# Altium footprint library DBLib.PcbLib: 92 footprints (part 5 of 6)
Each footprint in its own frame and in the unit in brackets; x right, y up, seen from the top. Pads: shape width x height; smd on the part's side, far side on the other; paste and mask are expansions set on the pad; w line width, h text height; cw(c..) or ccw(c..) is an arc to the next point about the centre after c.
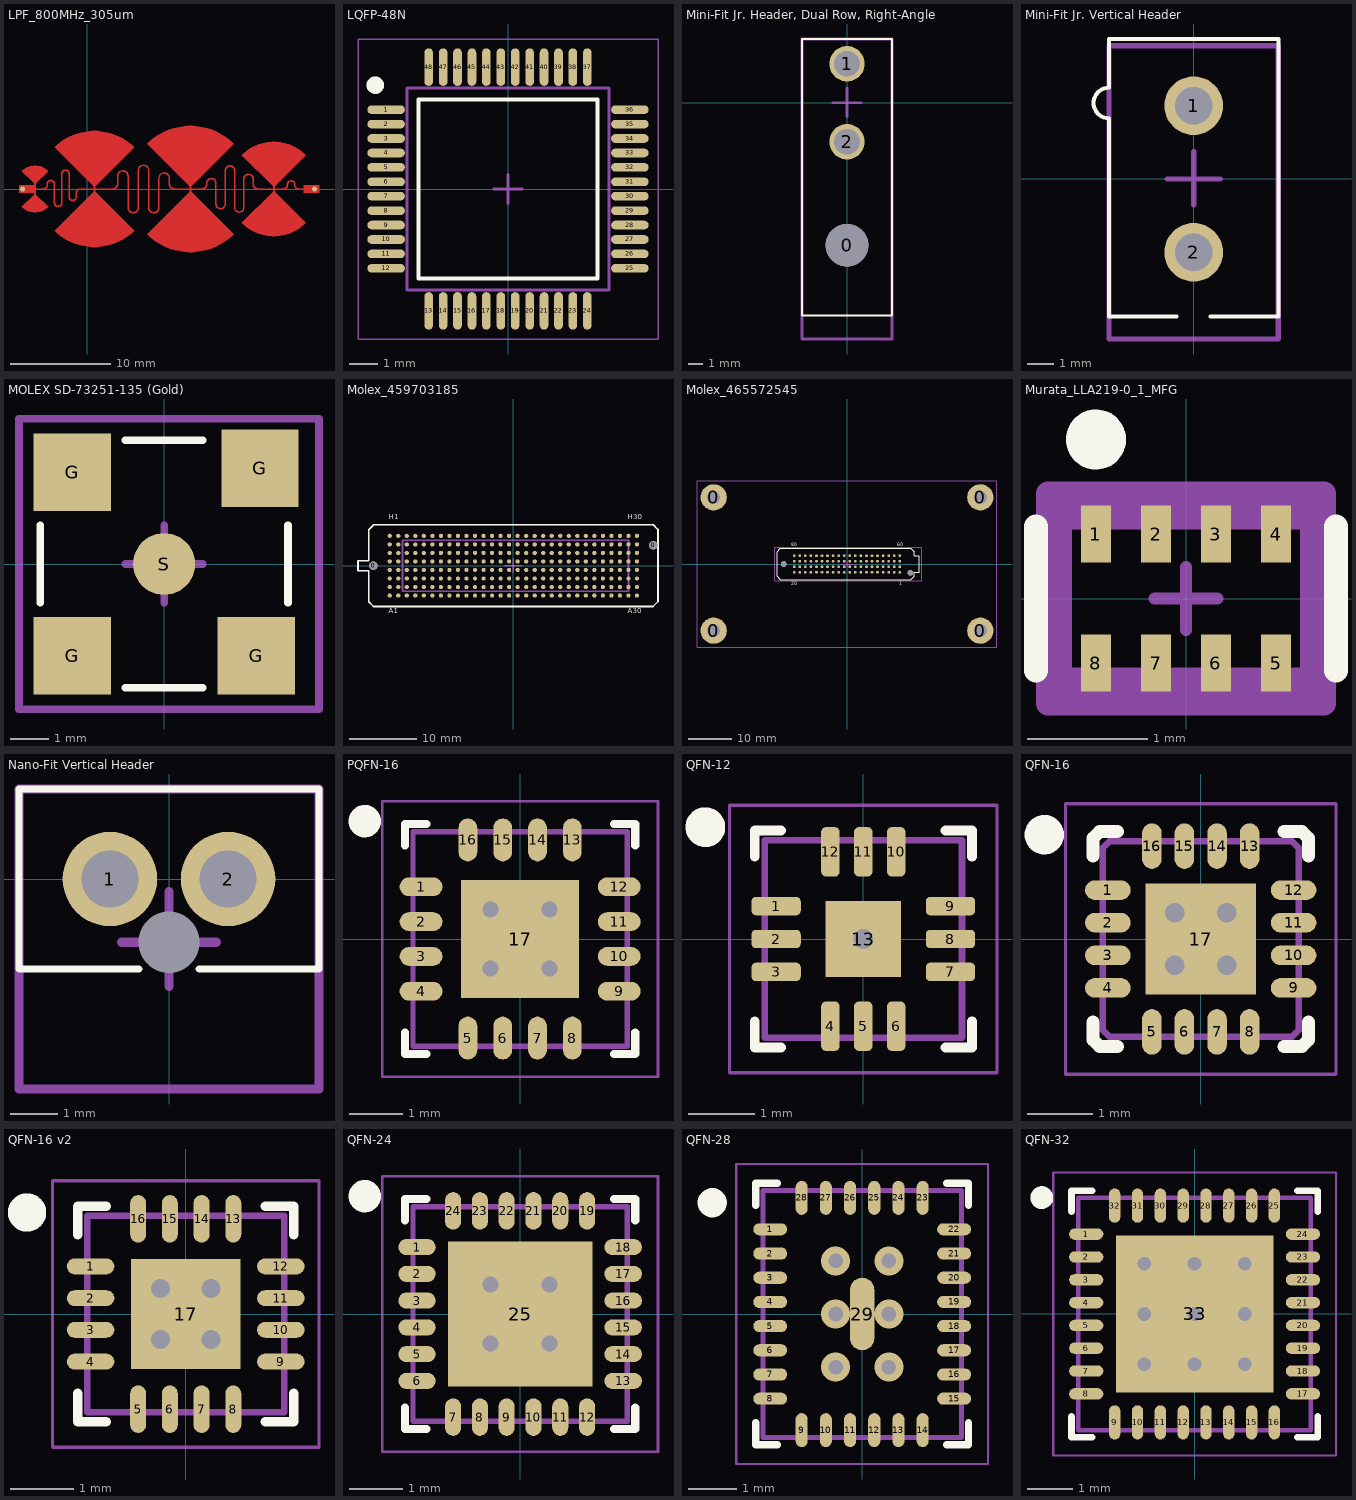
[diagram p4: the footprints below, top view; thin cyan lines are the x and y axes]

## LPF_800MHz_305um [mm] "stripline LPF"
pads (2):
  round 0.5 smd: IN(-6.4,0) OUT(22.606,0)
Top Layer:
  region: -6.757,-0.355 -5.232,-0.355 -5.232,0.355 -6.757,0.355
  region: -5.232,-0.562 -5.234,-0.562 -5.236,-0.561 -5.238,-0.559 -5.239,-0.557 -5.239,-0.555 -5.239,0.555 -5.239,0.557 -5.238,0.559 -5.236,0.561 -5.234,0.562 -5.232,0.562 -5.08,0.562 -5.079,0.562 -5.076,0.561 -5.074,0.559 -5.073,0.557 -5.073,0.555 -5.073,-0.555 -5.073,-0.557 -5.074,-0.559 -5.076,-0.561 -5.079,-0.562 -5.08,-0.562
  region: -5.232,0.555 -6.459,1.782 -6.331,1.911 -6.029,2.112 -5.694,2.251 -5.338,2.322 -5.156,2.322 -4.975,2.322 -4.619,2.251 -4.283,2.112 -3.981,1.911 -3.853,1.782 -5.08,0.555
  region: -6.459,-1.782 -6.331,-1.911 -6.029,-2.112 -5.694,-2.251 -5.338,-2.322 -5.156,-2.322 -4.975,-2.322 -4.619,-2.251 -4.283,-2.112 -3.981,-1.911 -3.853,-1.782 -5.08,-0.555 -5.232,-0.555
  region: 0.658,-0.262 0.658,0.262 0.811,0.262 0.811,-0.262
  region: -3.212,-4.133 -3.018,-4.326 -2.594,-4.674 -2.138,-4.979 -1.655,-5.237 -1.148,-5.447 -0.623,-5.607 -0.086,-5.714 0.46,-5.767 0.734,-5.767 1.008,-5.767 1.554,-5.714 2.092,-5.607 2.617,-5.447 3.123,-5.237 3.607,-4.979 4.063,-4.674 4.487,-4.326 4.681,-4.133 0.811,-0.262 0.658,-0.262
  region: 0.658,0.262 -3.212,4.133 -3.018,4.326 -2.594,4.674 -2.138,4.979 -1.655,5.237 -1.148,5.447 -0.623,5.607 -0.086,5.714 0.46,5.767 0.734,5.767 1.008,5.767 1.554,5.714 2.092,5.607 2.617,5.447 3.123,5.237 3.607,4.979 4.063,4.674 4.487,4.326 4.681,4.133 0.811,0.262
  region: 10.201,-0.262 10.354,-0.262 10.354,0.262 10.201,0.262
  region: 5.977,4.487 10.201,0.262 10.354,0.262 14.578,4.487 14.367,4.698 13.905,5.077 13.408,5.409 12.881,5.691 12.329,5.92 11.757,6.093 11.171,6.21 10.576,6.268 10.278,6.268 9.979,6.268 9.384,6.21 8.798,6.093 8.226,5.92 7.674,5.691 7.147,5.409 6.65,5.077 6.188,4.698
  region: 5.977,-4.487 6.188,-4.698 6.65,-5.077 7.147,-5.409 7.674,-5.691 8.226,-5.92 8.798,-6.093 9.384,-6.21 9.979,-6.268 10.278,-6.268 10.576,-6.268 11.171,-6.21 11.757,-6.093 12.329,-5.92 12.881,-5.691 13.408,-5.409 13.905,-5.077 14.367,-4.698 14.578,-4.487 10.354,-0.262 10.201,-0.262
  region: 18.486,-0.262 18.486,0.262 18.638,0.262 18.638,-0.262
  region: 15.379,-3.369 15.536,-3.525 15.878,-3.806 16.245,-4.052 16.635,-4.26 17.044,-4.429 17.467,-4.558 17.901,-4.644 18.341,-4.687 18.562,-4.687 18.783,-4.687 19.223,-4.644 19.657,-4.558 20.08,-4.429 20.489,-4.26 20.879,-4.052 21.247,-3.806 21.588,-3.525 21.745,-3.369 18.638,-0.262 18.486,-0.262
  region: 15.379,3.369 18.486,0.262 18.638,0.262 21.745,3.369 21.588,3.525 21.247,3.806 20.879,4.052 20.489,4.26 20.08,4.429 19.657,4.558 19.223,4.644 18.783,4.687 18.562,4.687 18.341,4.687 17.901,4.644 17.467,4.558 17.044,4.429 16.635,4.26 16.245,4.052 15.878,3.806 15.536,3.525
  region: 21.528,-0.355 21.528,0.355 23.053,0.355 23.053,-0.355
  lines w0.125: -5.08,0 -4.318,0 ccw(c-4.318,0.362) -3.956,0.362 -3.956,0.486 cw(c-3.593,0.486) -3.593,0.848 ; 0.658,0 0,0 -0.693,0 ccw(c-0.693,-0.362) -1.056,-0.362 -1.056,-0.782 cw(c-1.418,-0.782) -1.418,-1.145 ; 0.811,0 2.54,0 ccw(c2.54,0.512) 3.052,0.512 3.052,1.299 cw(c3.565,1.299) 3.565,1.812 ; 10.201,0 9.652,0 8.69,0 cw(c8.69,0.513) 8.177,0.513 8.177,1.081 ccw(c7.665,1.081) 7.665,1.594 ; 10.354,0 11.43,0 ccw(c11.43,0.462) 11.892,0.462 11.892,0.57 cw(c12.355,0.57) 12.355,1.033 ; 18.486,0 17.78,0 16.98,0 cw(c16.98,0.462) 16.517,0.462 16.517,1 ccw(c16.055,1) 16.055,1.462 ; 18.638,0 19.558,0 ccw(c19.558,0.362) 19.92,0.362 19.92,0.449 cw(c20.283,0.449) 20.283,0.811 ; 21.528,0 21.336,0 21.008,0 cw(c21.008,0.362) 20.645,0.362 20.645,0.449 ccw(c20.283,0.449) 20.283,0.811 ; -3.593,0.848 cw(c-3.593,0.486) -3.231,0.486 -3.231,0 -3.231,-1.379 ccw(c-2.868,-1.379) -2.868,-1.741 ; -3.593,0.848 -3.593,0.848 ; -3.593,0.848 -3.593,0.848 ; -2.868,-1.741 ccw(c-2.868,-1.379) -2.506,-1.379 -2.506,0 -2.506,1.507 cw(c-2.143,1.507) -2.143,1.87 ; -2.868,-1.741 -2.868,-1.741 ; -2.868,-1.741 -2.868,-1.741 ; -2.143,1.87 cw(c-2.143,1.507) -1.781,1.507 -1.781,0 -1.781,-0.782 ccw(c-1.418,-0.782) -1.418,-1.145 ; -2.143,1.87 -2.143,1.87 ; -2.143,1.87 -2.143,1.87 ; -1.418,-1.145 -1.418,-1.145 ; -1.418,-1.145 -1.418,-1.145 ; 3.565,1.812 cw(c3.565,1.299) 4.077,1.299 4.077,0 4.077,-1.84 ccw(c4.59,-1.84) 4.59,-2.353 ; 3.565,1.812 3.565,1.812 ; 3.565,1.812 3.565,1.812 ; 4.59,-2.353 ccw(c4.59,-1.84) 5.102,-1.84 5.102,0 5.102,1.84 cw(c5.615,1.84) 5.615,2.353 ; 4.59,-2.353 4.59,-2.353 ; 4.59,-2.353 4.59,-2.353 ; 5.615,2.353 cw(c5.615,1.84) 6.127,1.84 6.127,0 6.127,-1.84 ccw(c6.64,-1.84) 6.64,-2.353 ; 5.615,2.353 5.615,2.353 ; 5.615,2.353 5.615,2.353 ; 6.64,-2.353 ccw(c6.64,-1.84) 7.152,-1.84 7.152,0 7.152,1.081 cw(c7.665,1.081) 7.665,1.594 ; 6.64,-2.353 6.64,-2.353 ; 6.64,-2.353 6.64,-2.353 ; 7.665,1.594 7.665,1.594 ; 7.665,1.594 7.665,1.594 ; 12.355,1.033 cw(c12.355,0.57) 12.817,0.57 12.817,0 12.817,-1.495 ccw(c13.28,-1.495) 13.28,-1.958 ; 12.355,1.033 12.355,1.033 ; 12.355,1.033 12.355,1.033 ; 13.28,-1.958 ccw(c13.28,-1.495) 13.742,-1.495 13.742,0 13.742,1.844 cw(c14.205,1.844) 14.205,2.306 ; 13.28,-1.958 13.28,-1.958 ; 13.28,-1.958 13.28,-1.958 ; 14.205,2.306 cw(c14.205,1.844) 14.667,1.844 14.667,0 14.667,-1.844 ccw(c15.13,-1.844) 15.13,-2.306 ; 14.205,2.306 14.205,2.306 ; 14.205,2.306 14.205,2.306 ; 15.13,-2.306 ccw(c15.13,-1.844) 15.592,-1.844 15.592,0 15.592,1 cw(c16.055,1) 16.055,1.462 ; 15.13,-2.306 15.13,-2.306 ; 15.13,-2.306 15.13,-2.306 ; 16.055,1.462 16.055,1.462 ; 16.055,1.462 16.055,1.462 ; 20.283,0.811 20.283,0.811 ; 20.283,0.811 20.283,0.811

## LQFP-48N [mm] "TSQFP, 48-Leads, Body 7,00x7,00mm, Pitch 0,50mm, IPC Medium Density"
height 1.6
pads (48):
  oval 1.3x0.3 smd: 1(-4.225,2.75) 2(-4.225,2.25) 3(-4.225,1.75) 4(-4.225,1.25) 5(-4.225,0.75) 6(-4.225,0.25) 7(-4.225,-0.25) 8(-4.225,-0.75) 9(-4.225,-1.25) 10(-4.225,-1.75) 11(-4.225,-2.25) 12(-4.225,-2.75) 25(4.225,-2.75) 26(4.225,-2.25) 27(4.225,-1.75) 28(4.225,-1.25) 29(4.225,-0.75) 30(4.225,-0.25) 31(4.225,0.25) 32(4.225,0.75) 33(4.225,1.25) 34(4.225,1.75) 35(4.225,2.25) 36(4.225,2.75)
  oval 0.3x1.3 smd: 13(-2.75,-4.225) 14(-2.25,-4.225) 15(-1.75,-4.225) 16(-1.25,-4.225) 17(-0.75,-4.225) 18(-0.25,-4.225) 19(0.25,-4.225) 20(0.75,-4.225) 21(1.25,-4.225) 22(1.75,-4.225) 23(2.25,-4.225) 24(2.75,-4.225) 37(2.75,4.225) 38(2.25,4.225) 39(1.75,4.225) 40(1.25,4.225) 41(0.75,4.225) 42(0.25,4.225) 43(-0.25,4.225) 44(-0.75,4.225) 45(-1.25,4.225) 46(-1.75,4.225) 47(-2.25,4.225) 48(-2.75,4.225)
Top Overlay:
  circle w0.35: c-4.6,3.6 r0.127
  lines w0.15: -3.1,-3.1 3.1,-3.1 3.1,3.1 -3.1,3.1 -3.1,-3.1
Mechanical 1:
  lines w0.05: -5.2,-5.2 5.2,-5.2 5.2,5.2 -5.2,5.2 -5.2,-5.2
  lines w0.1: -0.5,0 0.5,0 ; 0,-0.5 0,0.5 ; -3.5,-3.5 3.5,-3.5 3.5,3.5 -3.5,3.5 -3.5,-3.5
3D body "User Library-LQFP50P900X900X160.STEP": height 1.6, standoff 0, extent -4.5,-4.5 4.5,4.5

## Mini-Fit Jr. Header, Dual Row, Right-Angle [mm] "Mini-Fit Jr. Header, Dual Row, Right-Angle"
height 9.6
pads (3):
  round 3 hole 3 unplated: 0(0,-10.05)
  round 2.5 hole 1.8: 1(0,2.75) 2(0,-2.75)
Top Overlay:
  lines w0.15: -3.175,-15 -3.175,4.5 3.175,4.5 3.175,-15 -3.175,-15
Mechanical 1:
  lines w0.2: -1,0 1,0 ; 0,-0.97 0,1.03 ; -3.175,-16.668 3.175,-16.668 3.175,4.5 -3.175,4.5 -3.175,-16.668
3D body "026013114.stp": height 11.48, standoff -3.52, extent -2.7,-16.668 3.1,3.267

## Mini-Fit Jr. Vertical Header [mm] "4.20mm Pitch, Dual Row"
height 12.8
pads (2):
  round 2.2 hole 1.4: 1(0,2.75) 2(0,-2.75)
Top Overlay:
  lines w0.15: -0.635,-5.155 -3.175,-5.155 -3.175,2.275 cw(c-3.175,2.85) -3.175,3.425 -3.175,5.25 3.175,5.25 3.175,-5.155 0.635,-5.155
Mechanical 1:
  lines w0.2: -1,0 1,0 ; 0,-0.97 0,1.03 ; -3.175,-6 -3.175,5 3.175,5 3.175,-6 -3.175,-6
3D body "039281023.stp": height 12.88, standoff -3.42, extent -3.1,-5.95 3.1,5.05

## MOLEX SD-73251-135 (Gold) [mm]
pads (5):
  rect 2x2 smd: G(-2.375,-2.375) G(-2.375,2.375) G(2.375,-2.375) G(2.475,2.475)
  round 1.6 smd: S(0,0)
Top Overlay:
  lines w0.2: -3.2,-1 -3.2,1 ; -1,-3.2 1,-3.2 ; -1,3.2 1,3.2 ; 3.2,-1 3.2,1
Mechanical 1:
  lines w0.2: -1,0 1,0 ; 0,-1 0,1 ; -3.75,-3.75 4,-3.75 4,3.75 -3.75,3.75 -3.75,-3.75
3D body "MOLEX SD-73251-135 Gold.stp": height 9.52, standoff -0.11, extent -3.175,-3.175 3.175,3.175

## Molex_459703185 [mm] "SEARAY Plug, 240 Circuits, 2.00mm Unmated Height, 8 Rows"
height 2
pads (242):
  round 1.27 hole 1.27 unplated: 0(-20.845,0) 0(20.845,3.05)
  round 0.635 smd: A1(-18.415,-4.445) A2(-17.145,-4.445) A3(-15.875,-4.445) A4(-14.605,-4.445) A5(-13.335,-4.445) A6(-12.065,-4.445) A7(-10.795,-4.445) A8(-9.525,-4.445) A9(-8.255,-4.445) A10(-6.985,-4.445) A11(-5.715,-4.445) A12(-4.445,-4.445) A13(-3.175,-4.445) A14(-1.905,-4.445) A15(-0.635,-4.445) A16(0.635,-4.445) A17(1.905,-4.445) A18(3.175,-4.445) A19(4.445,-4.445) A20(5.715,-4.445) A21(6.985,-4.445) A22(8.255,-4.445) A23(9.525,-4.445) A24(10.795,-4.445) A25(12.065,-4.445) A26(13.335,-4.445) A27(14.605,-4.445) A28(15.875,-4.445) A29(17.145,-4.445) A30(18.415,-4.445) B1(-18.415,-3.175) B2(-17.145,-3.175) B3(-15.875,-3.175) B4(-14.605,-3.175) B5(-13.335,-3.175) B6(-12.065,-3.175) B7(-10.795,-3.175) B8(-9.525,-3.175) B9(-8.255,-3.175) B10(-6.985,-3.175) B11(-5.715,-3.175) B12(-4.445,-3.175) B13(-3.175,-3.175) B14(-1.905,-3.175) B15(-0.635,-3.175) B16(0.635,-3.175) B17(1.905,-3.175) B18(3.175,-3.175) B19(4.445,-3.175) B20(5.715,-3.175) B21(6.985,-3.175) B22(8.255,-3.175) B23(9.525,-3.175) B24(10.795,-3.175) B25(12.065,-3.175) B26(13.335,-3.175) B27(14.605,-3.175) B28(15.875,-3.175) B29(17.145,-3.175) B30(18.415,-3.175) C1(-18.415,-1.905) C2(-17.145,-1.905) C3(-15.875,-1.905) C4(-14.605,-1.905) C5(-13.335,-1.905) C6(-12.065,-1.905) C7(-10.795,-1.905) C8(-9.525,-1.905) C9(-8.255,-1.905) C10(-6.985,-1.905) C11(-5.715,-1.905) C12(-4.445,-1.905) C13(-3.175,-1.905) C14(-1.905,-1.905) C15(-0.635,-1.905) C16(0.635,-1.905) C17(1.905,-1.905) C18(3.175,-1.905) C19(4.445,-1.905) C20(5.715,-1.905) C21(6.985,-1.905) C22(8.255,-1.905) C23(9.525,-1.905) C24(10.795,-1.905) C25(12.065,-1.905) C26(13.335,-1.905) C27(14.605,-1.905) C28(15.875,-1.905) C29(17.145,-1.905) C30(18.415,-1.905) D1(-18.415,-0.635) D2(-17.145,-0.635) D3(-15.875,-0.635) D4(-14.605,-0.635) D5(-13.335,-0.635) D6(-12.065,-0.635) D7(-10.795,-0.635) D8(-9.525,-0.635) D9(-8.255,-0.635) D10(-6.985,-0.635) D11(-5.715,-0.635) D12(-4.445,-0.635) D13(-3.175,-0.635) D14(-1.905,-0.635) D15(-0.635,-0.635) D16(0.635,-0.635) D17(1.905,-0.635) D18(3.175,-0.635) D19(4.445,-0.635) D20(5.715,-0.635) D21(6.985,-0.635) D22(8.255,-0.635) D23(9.525,-0.635) D24(10.795,-0.635) D25(12.065,-0.635) D26(13.335,-0.635) D27(14.605,-0.635) D28(15.875,-0.635) D29(17.145,-0.635) D30(18.415,-0.635) E1(-18.415,0.635) E2(-17.145,0.635) E3(-15.875,0.635) E4(-14.605,0.635) E5(-13.335,0.635) E6(-12.065,0.635) E7(-10.795,0.635) E8(-9.525,0.635) E9(-8.255,0.635) E10(-6.985,0.635) E11(-5.715,0.635) E12(-4.445,0.635) E13(-3.175,0.635) E14(-1.905,0.635) E15(-0.635,0.635) E16(0.635,0.635) E17(1.905,0.635) E18(3.175,0.635) E19(4.445,0.635) E20(5.715,0.635) E21(6.985,0.635) E22(8.255,0.635) E23(9.525,0.635) E24(10.795,0.635) E25(12.065,0.635) E26(13.335,0.635) E27(14.605,0.635) E28(15.875,0.635) E29(17.145,0.635) E30(18.415,0.635) F1(-18.415,1.905) F2(-17.145,1.905) F3(-15.875,1.905) F4(-14.605,1.905) F5(-13.335,1.905) F6(-12.065,1.905) F7(-10.795,1.905) F8(-9.525,1.905) F9(-8.255,1.905) F10(-6.985,1.905) F11(-5.715,1.905) F12(-4.445,1.905) F13(-3.175,1.905) F14(-1.905,1.905) F15(-0.635,1.905) F16(0.635,1.905) F17(1.905,1.905) F18(3.175,1.905) F19(4.445,1.905) F20(5.715,1.905) F21(6.985,1.905) F22(8.255,1.905) F23(9.525,1.905) F24(10.795,1.905) F25(12.065,1.905) F26(13.335,1.905) F27(14.605,1.905) F28(15.875,1.905) F29(17.145,1.905) F30(18.415,1.905) G1(-18.415,3.175) G2(-17.145,3.175) G3(-15.875,3.175) G4(-14.605,3.175) G5(-13.335,3.175) G6(-12.065,3.175) G7(-10.795,3.175) G8(-9.525,3.175) G9(-8.255,3.175) G10(-6.985,3.175) G11(-5.715,3.175) G12(-4.445,3.175) G13(-3.175,3.175) G14(-1.905,3.175) G15(-0.635,3.175) G16(0.635,3.175) G17(1.905,3.175) G18(3.175,3.175) G19(4.445,3.175) G20(5.715,3.175) G21(6.985,3.175) G22(8.255,3.175) G23(9.525,3.175) G24(10.795,3.175) G25(12.065,3.175) G26(13.335,3.175) G27(14.605,3.175) G28(15.875,3.175) G29(17.145,3.175) G30(18.415,3.175) H1(-18.415,4.445) H2(-17.145,4.445) H3(-15.875,4.445) H4(-14.605,4.445) H5(-13.335,4.445) H6(-12.065,4.445) H7(-10.795,4.445) H8(-9.525,4.445) H9(-8.255,4.445) H10(-6.985,4.445) H11(-5.715,4.445) H12(-4.445,4.445) H13(-3.175,4.445) H14(-1.905,4.445) H15(-0.635,4.445) H16(0.635,4.445) H17(1.905,4.445) H18(3.175,4.445) H19(4.445,4.445) H20(5.715,4.445) H21(6.985,4.445) H22(8.255,4.445) H23(9.525,4.445) H24(10.795,4.445) H25(12.065,4.445) H26(13.335,4.445) H27(14.605,4.445) H28(15.875,4.445) H29(17.145,4.445) H30(18.415,4.445)
Top Overlay:
  lines w0.254: -23.145,-0.76 -23.145,0.76 -21.545,0.76 -21.545,5.335 -20.8,6.08 20.844,6.08 21.545,5.379 21.545,-5.334 20.799,-6.08 -20.844,-6.08 -21.545,-5.379 -21.545,-0.76 -23.145,-0.76
  text "A30" at 17.018,-7.366 h1.27
  text "A1" at -18.542,-7.366 h1.27
  text "H30" at 17.018,6.604 h1.27
  text "H1" at -18.542,6.604 h1.27
Mechanical 1:
  lines w0.254: -1.016,0 1.016,0 ; 0,-0.762 0,0.762
Mechanical 15:
  lines w0.254: 0,-1.016 0,1.016 ; 0,-0.635 0,0.635 ; 0.635,0 1.27,0 ; 1.27,0 -1.27,0 1.27,0 ; -16.51,-3.81 -16.51,3.81 17.145,3.81 17.145,-3.81 -16.51,-3.81
3D body "459703185.stp": height 5.68, standoff -1.21, extent -23.127,-6.071 21.552,6.071

## Molex_465572545 [mm] "CONN FML 80POS 4ROWS GOLD"
height 8
pads (86):
  round 6 hole 3: 0(-30.48,-15.24) 0(-30.48,15.24) 0(30.48,-15.24) 0(30.48,15.24)
  round 1.27 hole 1.27 unplated: 0(-14.495,0) 0(14.495,-2.01)
  round 0.64 smd: 1(12.065,-1.905) 2(10.795,-1.905) 3(9.525,-1.905) 4(8.255,-1.905) 5(6.985,-1.905) 6(5.715,-1.905) 7(4.445,-1.905) 8(3.175,-1.905) 9(1.905,-1.905) 10(0.635,-1.905) 11(-0.635,-1.905) 12(-1.905,-1.905) 13(-3.175,-1.905) 14(-4.445,-1.905) 15(-5.715,-1.905) 16(-6.985,-1.905) 17(-8.255,-1.905) 18(-9.525,-1.905) 19(-10.795,-1.905) 20(-12.065,-1.905) 21(12.065,-0.635) 22(10.795,-0.635) 23(9.525,-0.635) 24(8.255,-0.635) 25(6.985,-0.635) 26(5.715,-0.635) 27(4.445,-0.635) 28(3.175,-0.635) 29(1.905,-0.635) 30(0.635,-0.635) 31(-0.635,-0.635) 32(-1.905,-0.635) 33(-3.175,-0.635) 34(-4.445,-0.635) 35(-5.715,-0.635) 36(-6.985,-0.635) 37(-8.255,-0.635) 38(-9.525,-0.635) 39(-10.795,-0.635) 40(-12.065,-0.635) 41(12.065,0.635) 42(10.795,0.635) 43(9.525,0.635) 44(8.255,0.635) 45(6.985,0.635) 46(5.715,0.635) 47(4.445,0.635) 48(3.175,0.635) 49(1.905,0.635) 50(0.635,0.635) 51(-0.635,0.635) 52(-1.905,0.635) 53(-3.175,0.635) 54(-4.445,0.635) 55(-5.715,0.635) 56(-6.985,0.635) 57(-8.255,0.635) 58(-9.525,0.635) 59(-10.795,0.635) 60(-12.065,0.635) 61(12.065,1.905) 62(10.795,1.905) 63(9.525,1.905) 64(8.255,1.905) 65(6.985,1.905) 66(5.715,1.905) 67(4.445,1.905) 68(3.175,1.905) 69(1.905,1.905) 70(0.635,1.905) 71(-0.635,1.905) 72(-1.905,1.905) 73(-3.175,1.905) 74(-4.445,1.905) 75(-5.715,1.905) 76(-6.985,1.905) 77(-8.255,1.905) 78(-9.525,1.905) 79(-10.795,1.905) 80(-12.065,1.905)
Top Overlay:
  lines w0.178: -16.002,-2.794 -15.24,-3.556 14.605,-3.556 15.367,-2.794 15.367,-1.905 16.51,-1.905 16.51,1.905 15.367,1.905 15.367,2.794 14.605,3.556 -15.24,3.556 -16.002,2.794 -16.002,-2.794
  text "80" at -12.7,4.064 h0.76
  text "60" at 11.43,4.064 h0.76
  text "20" at -12.7,-4.826 h0.76
  text "1" at 11.938,-4.826 h0.76
Mechanical 13:
  lines w0.254: -34.29,-19.05 -34.29,19.05 34.29,19.05 34.29,-19.05 -34.29,-19.05
Mechanical 15:
  lines w0.254: -1.27,0 1.27,0 0.635,0 ; 0,-0.635 0,0.635 ; -16.51,-3.81 17.145,-3.81 17.145,3.81 -16.51,3.81 -16.51,-3.81
3D body "465572545.stp": height 7.98, standoff -1.34, extent -16.027,-3.505 16.535,3.556

## Murata_LLA219-0_1_MFG [mm]
pads (8):
  rect 0.25x0.475 smd paste+0 mask+0: 1(-0.75,0.537) 2(-0.25,0.537) 3(0.25,0.537) 4(0.75,0.537) 5(0.75,-0.537) 6(0.25,-0.537) 7(-0.25,-0.537) 8(-0.75,-0.537)
Top Overlay:
  circle w0.25: c-0.75,1.325 r0.125
  lines w0.2: -1.25,-0.6 -1.25,0.6 ; 1.25,-0.6 1.25,0.6
Mechanical 10:
  lines w0.2: -1.15,-0.875 1.15,-0.875 1.15,0.875 -1.15,0.875 -1.15,-0.875
Mechanical 12:
  lines w0.2: -1.05,-0.675 1.05,-0.675 1.05,0.675 -1.05,0.675 -1.05,-0.675
Mechanical 15:
  lines w0.1: -0.262,0 0.262,0 ; 0,-0.262 0,0.262
  lines w0.2: -1.15,-0.875 1.15,-0.875 1.15,0.875 -1.15,0.875 -1.15,-0.875
3D body "Cap_Murata_LLA219C70G225MA01L_eec.STEP": height 0.25, standoff 0, extent -1.15,-0.875 1.15,0.875

## Nano-Fit Vertical Header [mm] "Through Hole, 2.50mm Pitch"
height 10
pads (3):
  round 0 hole 1.3 unplated: 0(0,-1.34)
  round 2 hole 1.2: 1(-1.25,0) 2(1.25,0)
Top Overlay:
  lines w0.15: -0.635,-1.905 -3.175,-1.905 -3.175,1.905 3.175,1.905 3.175,-1.905 0.635,-1.905
Mechanical 1:
  lines w0.2: -1,-1.34 1,-1.34 ; 0,-2.27 0,-0.27 ; -3.175,-4.445 3.175,-4.445 3.175,1.905 -3.175,1.905 -3.175,-4.445
3D body "1053091202.stp": height 10.53, standoff -3.18, extent -2.97,-4.6 2.97,1.74

## PQFN-16 [mm] "PQFN, 16-Leads, Body 4,00x4,00mm, Pitch 0,65mm, Thermal Pad 2,15x2,15mm, IPC Medium Density"
height 0.8
pads (17):
  oval 0.8x0.35 smd: 1(-1.85,0.975) 2(-1.85,0.325) 3(-1.85,-0.325) 4(-1.85,-0.975) 9(1.85,-0.975) 10(1.85,-0.325) 11(1.85,0.325) 12(1.85,0.975)
  oval 0.35x0.8 smd: 5(-0.975,-1.85) 6(-0.325,-1.85) 7(0.325,-1.85) 8(0.975,-1.85) 13(0.975,1.85) 14(0.325,1.85) 15(-0.325,1.85) 16(-0.975,1.85)
  rect 2.2x2.2 all layers, no hole mask+0.102: 17(0,0)
via 0.55,0.55 diameter 0.6 hole 0.3
via -0.55,0.55 diameter 0.6 hole 0.3
via -0.55,-0.55 diameter 0.6 hole 0.3
via 0.55,-0.55 diameter 0.6 hole 0.3
Top Overlay:
  circle w0.35: c-2.9,2.2 r0.127
  lines w0.15: -2.15,-1.75 -2.15,-2.15 -1.75,-2.15 ; -2.15,1.75 -2.15,2.15 -1.75,2.15 ; 1.75,-2.15 2.15,-2.15 2.15,-1.75 ; 1.75,2.15 2.15,2.15 2.15,1.75
Mechanical 1:
  lines w0.05: -2.575,-2.575 2.575,-2.575 2.575,2.575 -2.575,2.575 -2.575,-2.575
  lines w0.1: -0.5,0 0.5,0 ; 0,-0.5 0,0.5 ; -2,-2 2,-2 2,2 -2,2 -2,-2
3D body "ALSRobot-QFN16 4x4.step": height 0.92, standoff 0, extent -2,-2 2,2

## QFN-12 [mm]
pads (13):
  rrect50% 0.75x0.28 smd: 1(-1.325,0.5) 2(-1.325,0) 3(-1.325,-0.5) 7(1.325,-0.5) 8(1.325,0) 9(1.325,0.5)
  rrect50% 0.28x0.75 smd: 4(-0.5,-1.325) 5(0,-1.325) 6(0.5,-1.325) 10(0.5,1.325) 11(0,1.325) 12(-0.5,1.325)
  rect 1.15x1.15 all layers, no hole mask+0.102: 13(0,0)
via 0,0 diameter 0.6 hole 0.3
Top Overlay:
  circle w0.35: c-2.4,1.7 r0.127
  lines w0.15: -1.65,-1.25 -1.65,-1.65 -1.25,-1.65 ; -1.65,1.25 -1.65,1.65 -1.25,1.65 ; 1.25,-1.65 1.65,-1.65 1.65,-1.25 ; 1.25,1.65 1.65,1.65 1.65,1.25
Mechanical 1:
  lines w0.05: -2.032,-2.032 -2.032,2.032 2.032,2.032 2.032,-2.032 -2.032,-2.032
  lines w0.1: -0.5,0 0.5,0 ; 0,-0.5 0,0.5 ; -1.5,-1.5 -1.5,1.5 1.5,1.5 1.5,-1.5 -1.5,-1.5
3D body "User Library-QFN12_05.step": height 0.9, standoff 0, extent -1.505,-1.505 1.505,1.505

## QFN-16 [mm] "QFN, 16-Leads, Body 3,00x3,00mm, Pitch 0,50mm, Thermal Pad 1,70x1,70mm, IPC Medium Density"
height 0.9
pads (17):
  oval 0.7x0.3 smd: 1(-1.425,0.75) 2(-1.425,0.25) 3(-1.425,-0.25) 4(-1.425,-0.75) 9(1.425,-0.75) 10(1.425,-0.25) 11(1.425,0.25) 12(1.425,0.75)
  oval 0.3x0.7 smd: 5(-0.75,-1.425) 6(-0.25,-1.425) 7(0.25,-1.425) 8(0.75,-1.425) 13(0.75,1.425) 14(0.25,1.425) 15(-0.25,1.425) 16(-0.75,1.425)
  rect 1.7x1.7 all layers, no hole mask+0.102: 17(0,0)
via -0.4,0.4 diameter 0.6 hole 0.3
via -0.4,-0.4 diameter 0.6 hole 0.3
via 0.4,-0.4 diameter 0.6 hole 0.3
via 0.4,0.4 diameter 0.6 hole 0.3
Top Overlay:
  circle w0.35: c-2.4,1.6 r0.127
  lines w0.2: -1.65,-1.275 -1.65,-1.55 -1.55,-1.65 -1.275,-1.65 ; -1.65,1.275 -1.65,1.55 -1.55,1.65 -1.275,1.65 ; 1.275,-1.65 1.55,-1.65 1.65,-1.55 1.65,-1.275 ; 1.275,1.65 1.55,1.65 1.65,1.55 1.65,1.275
Mechanical 1:
  lines w0.05: -2.075,-2.075 2.075,-2.075 2.075,2.075 -2.075,2.075 -2.075,-2.075
  lines w0.1: -0.5,0 0.5,0 ; 0,-0.5 0,0.5 ; -1.5,-1.4 -1.5,1.4 -1.4,1.5 1.4,1.5 1.5,1.4 1.5,-1.4 1.4,-1.5 -1.4,-1.5 -1.5,-1.4
3D body "User Library-qfn16-3x3.step": height 0.92, standoff 0, extent -1.5,-1.5 1.5,1.5

## QFN-16 v2 [mm] "QFN, 16-Leads, Body 3,00x3,00mm, Pitch 0,50mm, Thermal Pad 1,73x1,73mm, IPC Medium Density"
height 1
pads (17):
  oval 0.75x0.25 smd: 1(-1.5,0.75) 2(-1.5,0.25) 3(-1.5,-0.25) 4(-1.5,-0.75) 9(1.5,-0.75) 10(1.5,-0.25) 11(1.5,0.25) 12(1.5,0.75)
  oval 0.25x0.75 smd: 5(-0.75,-1.5) 6(-0.25,-1.5) 7(0.25,-1.5) 8(0.75,-1.5) 13(0.75,1.5) 14(0.25,1.5) 15(-0.25,1.5) 16(-0.75,1.5)
  rect 1.73x1.73 all layers, no hole mask+0.102: 17(0,0)
via 0.4,0.4 diameter 0.6 hole 0.3
via 0.4,-0.4 diameter 0.6 hole 0.3
via -0.4,-0.4 diameter 0.6 hole 0.3
via -0.4,0.4 diameter 0.6 hole 0.3
Top Overlay:
  circle w0.35: c-2.5,1.6 r0.127
  lines w0.15: -1.7,-1.25 -1.7,-1.7 -1.25,-1.7 ; -1.7,1.25 -1.7,1.7 -1.25,1.7 ; 1.25,-1.7 1.7,-1.7 1.7,-1.25 ; 1.25,1.7 1.7,1.7 1.7,1.25
Mechanical 1:
  lines w0.05: -2.1,-2.1 -2.1,2.1 2.1,2.1 2.1,-2.1 -2.1,-2.1
  lines w0.1: -0.5,0 0.5,0 ; 0,-0.5 0,0.5 ; -1.55,-1.55 -1.55,1.55 1.55,1.55 1.55,-1.55 -1.55,-1.55
3D body "User Library-HMC713LP3.step": height 1, standoff 0, extent -1.5,-1.5 1.5,1.5

## QFN-24 [mm] "QFN, 24-Leads, Body 4,00x4,00mm, Pitch 0,50mm, Thermal Pad 2,70x2,70mm, IPC Medium Density"
height 0.9
pads (25):
  oval 0.7x0.3 smd: 1(-1.925,1.25) 2(-1.925,0.75) 3(-1.925,0.25) 4(-1.925,-0.25) 5(-1.925,-0.75) 6(-1.925,-1.25) 13(1.925,-1.25) 14(1.925,-0.75) 15(1.925,-0.25) 16(1.925,0.25) 17(1.925,0.75) 18(1.925,1.25)
  oval 0.3x0.7 smd: 7(-1.25,-1.925) 8(-0.75,-1.925) 9(-0.25,-1.925) 10(0.25,-1.925) 11(0.75,-1.925) 12(1.25,-1.925) 19(1.25,1.925) 20(0.75,1.925) 21(0.25,1.925) 22(-0.25,1.925) 23(-0.75,1.925) 24(-1.25,1.925)
  rect 2.7x2.7 all layers, no hole mask+0.102: 25(0,0)
via 0.55,-0.55 diameter 0.6 hole 0.3
via -0.55,-0.55 diameter 0.6 hole 0.3
via -0.55,0.55 diameter 0.6 hole 0.3
via 0.55,0.55 diameter 0.6 hole 0.3
Top Overlay:
  circle w0.35: c-2.9,2.2 r0.127
  lines w0.15: -2.15,-1.75 -2.15,-2.15 -1.75,-2.15 ; -2.15,1.75 -2.15,2.15 -1.75,2.15 ; 1.75,-2.15 2.15,-2.15 2.15,-1.75 ; 1.75,2.15 2.15,2.15 2.15,1.75
Mechanical 1:
  lines w0.05: -2.575,-2.575 -2.575,2.575 2.575,2.575 2.575,-2.575 -2.575,-2.575
  lines w0.1: -0.5,0 0.5,0 ; 0,-0.5 0,0.5 ; -2,-2 -2,2 2,2 2,-2 -2,-2
3D body "User Library-QFN24.step": height 0.9, standoff 0, extent -2.005,-2.005 2.005,2.005

## QFN-28 [mm] "QFN, 28-Leads, Body 4,00x5,00mm, Pitch 0,50mm, Thermal Pad 2,50x3,50mm, IPC Medium Density"
height 0.9
pads (29):
  oval 0.7x0.25 smd: 1(-1.9,1.75) 2(-1.9,1.25) 3(-1.9,0.75) 4(-1.9,0.25) 5(-1.9,-0.25) 6(-1.9,-0.75) 7(-1.9,-1.25) 8(-1.9,-1.75) 15(1.9,-1.75) 16(1.9,-1.25) 17(1.9,-0.75) 18(1.9,-0.25) 19(1.9,0.25) 20(1.9,0.75) 21(1.9,1.25) 22(1.9,1.75)
  oval 0.25x0.7 smd: 9(-1.25,-2.4) 10(-0.75,-2.4) 11(-0.25,-2.4) 12(0.25,-2.4) 13(0.75,-2.4) 14(1.25,-2.4) 23(1.25,2.4) 24(0.75,2.4) 25(0.25,2.4) 26(-0.25,2.4) 27(-0.75,2.4) 28(-1.25,2.4)
  oval 0.5x1.5 all layers, no hole mask+0.102: 29(0,0)
via 0.55,-1.1 diameter 0.6 hole 0.3
via -0.55,-1.1 diameter 0.6 hole 0.3
via 0.55,0 diameter 0.6 hole 0.3
via -0.55,0 diameter 0.6 hole 0.3
via 0.55,1.1 diameter 0.6 hole 0.3
via -0.55,1.1 diameter 0.6 hole 0.3
Top Overlay:
  circle w0.35: c-3.1,2.3 r0.127
  lines w0.15: -2.2,-2.25 -2.2,-2.7 -1.75,-2.7 ; -2.2,2.25 -2.2,2.7 -1.75,2.7 ; 1.75,-2.7 2.2,-2.7 2.2,-2.25 ; 1.75,2.7 2.2,2.7 2.2,2.25
Mechanical 1:
  lines w0.05: -2.6,-3.1 -2.6,3.1 2.6,3.1 2.6,-3.1 -2.6,-3.1
  lines w0.1: -0.5,0 0.5,0 ; 0,-0.5 0,0.5 ; -2.05,-2.55 -2.05,2.55 2.05,2.55 2.05,-2.55 -2.05,-2.55
Multi-Layer:
  region: -1.325,1.469 -1.325,-1.825 1.325,-1.825 1.325,1.825 -0.969,1.825
3D body "User Library-QFN 28.step": height 0.75, standoff 0, extent -2.005,-2.505 2.005,2.505

## QFN-32 [mm] "QFN, 32-Leads, Body 5,00x5,00mm, Pitch 0,50mm, Thermal Pad 3,45x3,45mm, IPC Medium Density"
height 0.75
pads (33):
  oval 0.75x0.25 smd: 1(-2.375,1.75) 2(-2.375,1.25) 3(-2.375,0.75) 4(-2.375,0.25) 5(-2.375,-0.25) 6(-2.375,-0.75) 7(-2.375,-1.25) 8(-2.375,-1.75) 17(2.375,-1.75) 18(2.375,-1.25) 19(2.375,-0.75) 20(2.375,-0.25) 21(2.375,0.25) 22(2.375,0.75) 23(2.375,1.25) 24(2.375,1.75)
  oval 0.25x0.75 smd: 9(-1.75,-2.375) 10(-1.25,-2.375) 11(-0.75,-2.375) 12(-0.25,-2.375) 13(0.25,-2.375) 14(0.75,-2.375) 15(1.25,-2.375) 16(1.75,-2.375) 25(1.75,2.375) 26(1.25,2.375) 27(0.75,2.375) 28(0.25,2.375) 29(-0.25,2.375) 30(-0.75,2.375) 31(-1.25,2.375) 32(-1.75,2.375)
  rect 3.45x3.45 all layers, no hole mask+0.102: 33(0,0)
via -1.1,1.1 diameter 0.6 hole 0.3
via 0,1.1 diameter 0.6 hole 0.3
via 1.1,1.1 diameter 0.6 hole 0.3
via -1.1,0 diameter 0.6 hole 0.3
via 0,0 diameter 0.6 hole 0.3
via 1.1,0 diameter 0.6 hole 0.3
via -1.1,-1.1 diameter 0.6 hole 0.3
via 0,-1.1 diameter 0.6 hole 0.3
via 1.1,-1.1 diameter 0.6 hole 0.3
Top Overlay:
  circle w0.25: c-3.35,2.55 r0.125
  lines w0.15: -2.7,-2.25 -2.7,-2.7 -2.25,-2.7 ; -2.7,2.25 -2.7,2.7 -2.25,2.7 ; 2.25,-2.7 2.7,-2.7 2.7,-2.25 ; 2.25,2.7 2.7,2.7 2.7,2.25
Mechanical 1:
  lines w0.05: -3.1,-3.1 -3.1,3.1 3.1,3.1 3.1,-3.1 -3.1,-3.1
  lines w0.1: -0.5,0 0.5,0 ; 0,-0.5 0,0.5 ; -2.55,-2.55 -2.55,2.55 2.55,2.55 2.55,-2.55 -2.55,-2.55
3D body "User Library-QFN-32UH.step": height 0.75, standoff 0, extent -2.51,-2.51 2.51,2.51